# Altium integrated library Integrated_Circuts.IntLib: 76 symbols (part 4 of 4)

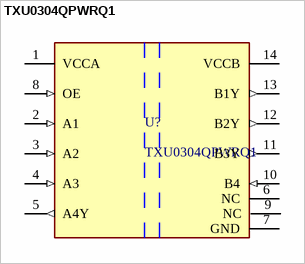
[diagram p69: symbol TXU0304QPWRQ1]

## TXU0304QPWRQ1
designator U?
Translation - Voltage Levels Automotive four chan nel unidirectional
footprint FP-PW0014A-IPC_A
footprint FP-PW0014A-IPC_B
footprint FP-PW0014A-IPC_C
footprint FP-PW0014A-MFG
pins: 1 VCCA (power), 2 A1 (in), 3 A2 (in), 4 A3 (in), 5 A4Y (out), 6 NC, 7 GND (power), 8 OE (in), 9 NC, 10 B4 (in), 11 B3Y (out), 12 B2Y (out), 13 B1Y (out), 14 VCCB (power)


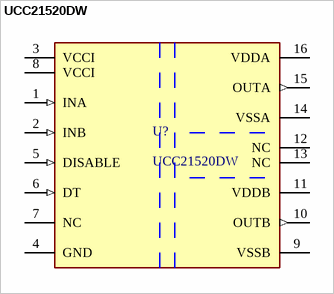
[diagram p70: symbol UCC21520DW]

## UCC21520DW
designator U?
footprint FP-DW0016B-MFG
footprint FP-DW0016B-IPC_B
footprint FP-DW0016B-IPC_A
footprint FP-DW0016B-IPC_C
pins: 1 INA (in), 2 INB (in), 3 VCCI (power), 4 GND (power), 5 DISABLE (in), 6 DT (in), 7 NC, 8 VCCI (power), 9 VSSB (power), 10 OUTB (out), 11 VDDB (power), 12 NC, 13 NC, 14 VSSA (power), 15 OUTA (out), 16 VDDA (power)


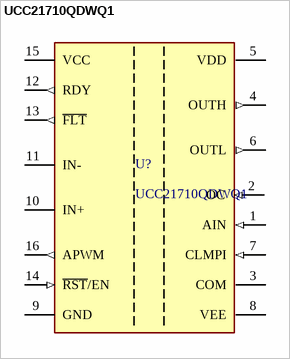
[diagram p71: symbol UCC21710QDWQ1]

## UCC21710QDWQ1
designator U?
footprint FP-DW0016B-IPC_A
footprint FP-DW0016B-IPC_B
footprint FP-DW0016B-IPC_C
footprint FP-DW0016B-MFG
pins: 1 AIN (in), 2 OC (in), 3 COM (power), 4 OUTH (out), 5 VDD (power), 6 OUTL (out), 7 CLMPI (in), 8 VEE (power), 9 GND (power), 10 IN+ (hiz), 11 IN- (hiz), 12 RDY (out), 13 ~{FLT} (out), 14 ~{RST}/EN (in), 15 VCC (power), 16 APWM (out)


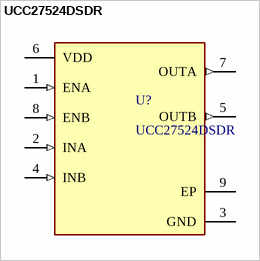
[diagram p72: symbol UCC27524DSDR]

## UCC27524DSDR
designator U?
IC GATE DVR LO-SIDE DL 5A 8SON
footprint FP-DSD0008D-IPC_A
footprint FP-DSD0008D-IPC_B
footprint FP-DSD0008D-IPC_C
pins: 1 ENA (in), 2 INA (in), 3 GND (power), 4 INB (in), 5 OUTB (out), 6 VDD (power), 7 OUTA (out), 8 ENB (in), 9 EP (power)


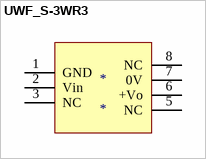
[diagram p73: symbol UWF_S-3WR3]

## UWF_S-3WR3
designator *
footprint UWF_S-3WR3
pins: 1 GND, 2 Vin, 3 NC, 5 NC, 6 +Vo, 7 0V, 8 NC


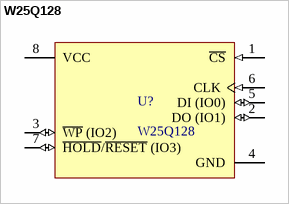
[diagram p74: symbol W25Q128]

## W25Q128
designator U?
footprint WINB-SOIC-8_L (SOIC, 8-Leads, Body 5.4x5.4mm, Pitch 1.27mm, IPC High Density)
footprint WINB-SOIC-8_M
footprint WINB-SOIC-8_N
footprint SOIC-8-MFG
pins: 1 ~{CS} (in) "Chip Select Input.", 2 DO (IO1) (io) "Data Output (Data Input Output 1).", 3 ~{WP} (IO2) (io) "Write Protect Input (Data Input Output 2).", 4 GND (power) "Ground.", 5 DI (IO0) (io) "Data Input (Data Input Output 0).", 6 CLK (in) "Serial Clock Input.", 7 ~{HOLD}/~{RESET} (IO3) (io) "Hold or Reset Input (Data Input Output 3).", 8 VCC (power) "Power Supply."


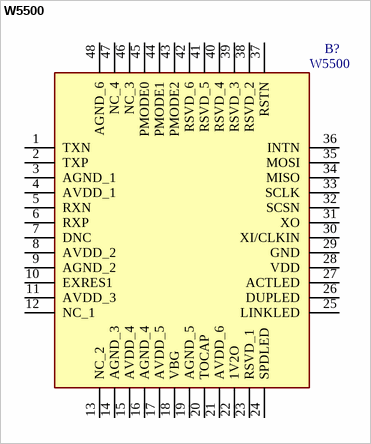
[diagram p75: symbol W5500]

## W5500
designator B?
Ethernet ICs 3in1 Enet Controller TCP/IP +MAC+PHY; Manufacturer_Name: Wiznet Technology; Geometry.Height: 1.6mm; Manufacturer_Part_Number: W5500; Mouser Part Number: *; Mouser Price/Stock: *; Arrow Part Number: W5500; Arrow Price/Stock: https://www.arrow.com/en/products/w5500/wiznet?utm_currency=USD&region=nac; Datasheet Link: https://docs.wiznet.io/img/products/w5500/W5500_ds_v110e.pdf
footprint QFP50P900X900X160-48N
pins: 1 TXN, 2 TXP, 3 AGND_1, 4 AVDD_1, 5 RXN, 6 RXP, 7 DNC, 8 AVDD_2, 9 AGND_2, 10 EXRES1, 11 AVDD_3, 12 NC_1, 13 NC_2, 14 AGND_3, 15 AVDD_4, 16 AGND_4, 17 AVDD_5, 18 VBG, 19 AGND_5, 20 TOCAP, 21 AVDD_6, 22 1V2O, 23 RSVD_1, 24 SPDLED, 25 LINKLED, 26 DUPLED, 27 ACTLED, 28 VDD, 29 GND, 30 XI/CLKIN, 31 XO, 32 SCSN, 33 SCLK, 34 MISO, 35 MOSI, 36 INTN, 37 RSTN, 38 RSVD_2, 39 RSVD_3, 40 RSVD_4, 41 RSVD_5, 42 RSVD_6, 43 PMODE2, 44 PMODE1, 45 PMODE0, 46 NC_3, 47 NC_4, 48 AGND_6